# Altium footprint library 3.22-杂项.PcbLib: 199 footprints (part 7 of 15)
Each footprint in its own frame and in the unit in brackets; x right, y up, seen from the top. Pads: shape width x height; smd on the part's side, far side on the other; paste and mask are expansions set on the pad; w line width, h text height; cw(c..) or ccw(c..) is an arc to the next point about the centre after c.
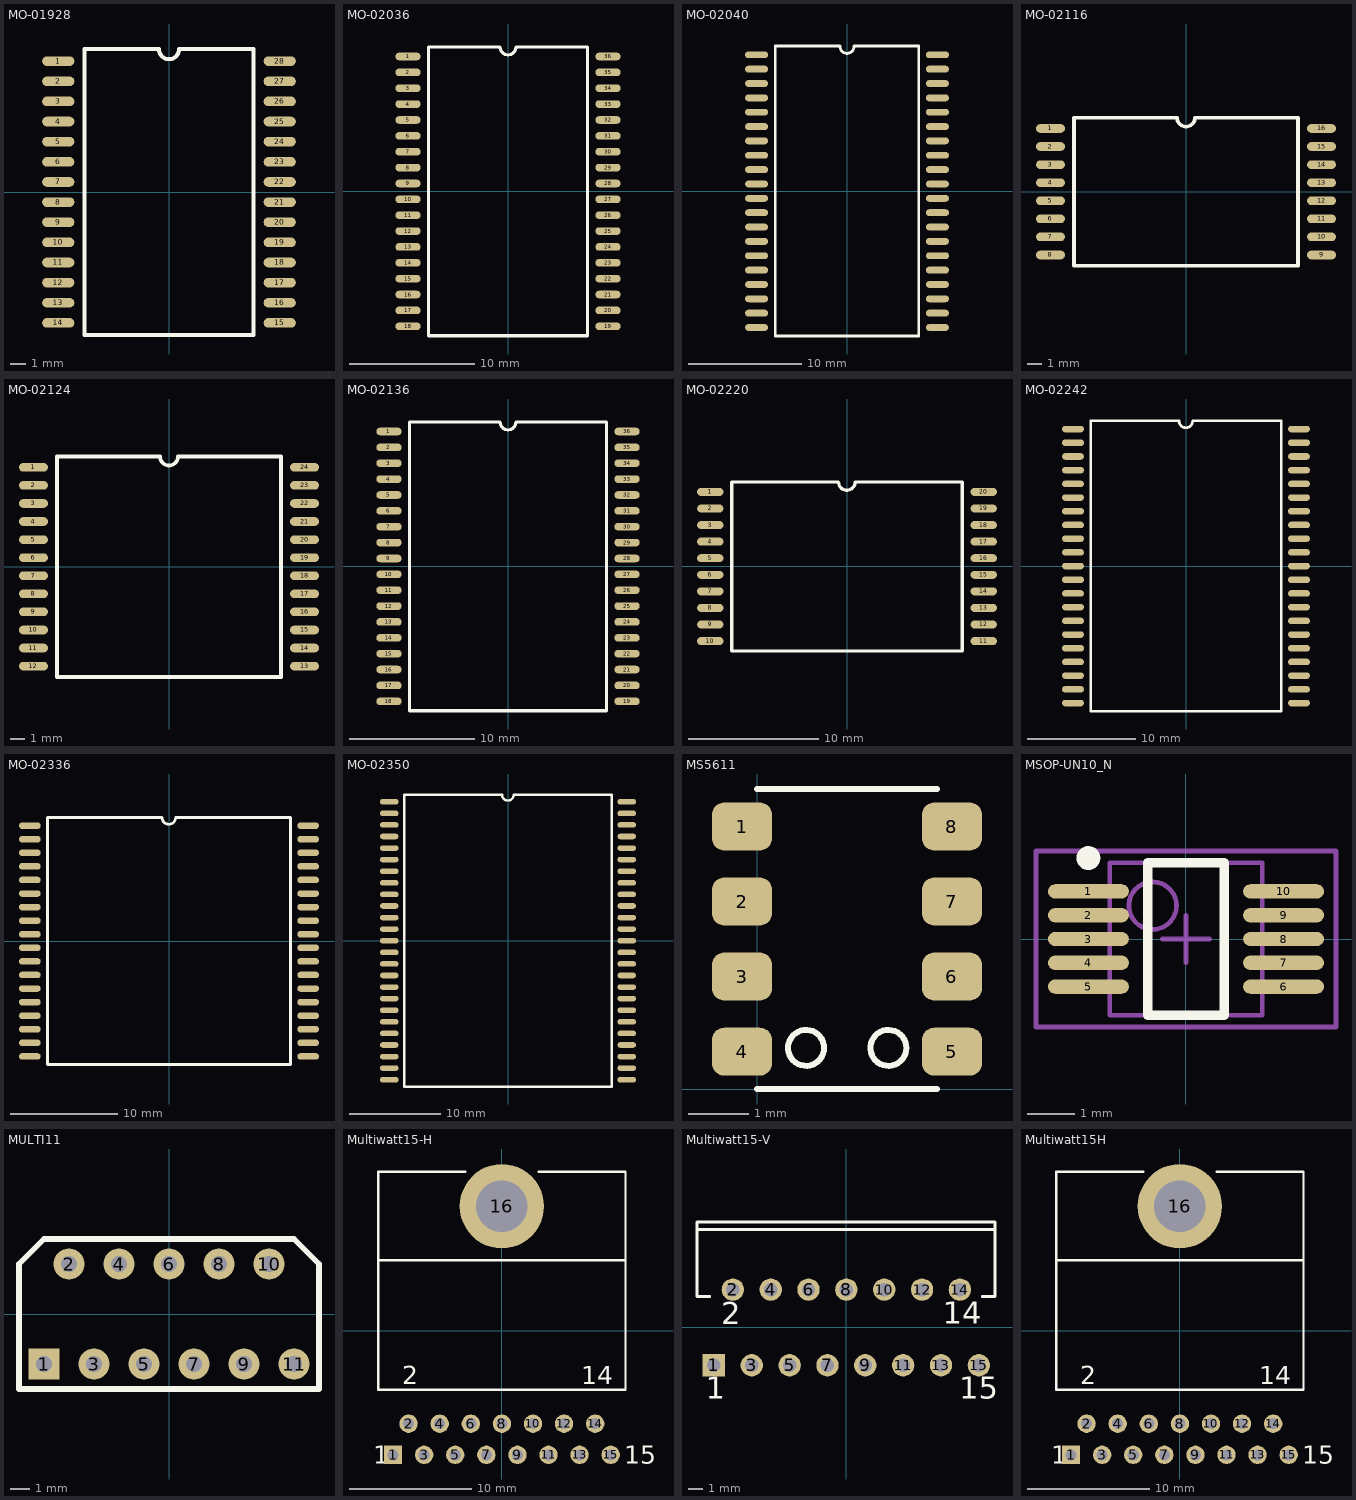
[diagram p6: the footprints below, top view; thin cyan lines are the x and y axes]

## MO-01928 [mil] "[ PCBѧϰȺ514746572 ]"
pads (28):
  oval 80x24 smd: 1(-275,325) 2(-275,275) 3(-275,225) 4(-275,175) 5(-275,125) 6(-275,75) 7(-275,25) 8(-275,-25) 9(-275,-75) 10(-275,-125) 11(-275,-175) 12(-275,-225) 13(-275,-275) 14(-275,-325) 15(275,-325) 16(275,-275) 17(275,-225) 18(275,-175) 19(275,-125) 20(275,-75) 21(275,-25) 22(275,25) 23(275,75) 24(275,125) 25(275,175) 26(275,225) 27(275,275) 28(275,325)
Top Overlay:
  lines w10: -210,-355 -210,355 -25,355 ccw(c0,355) 25,355 210,355 210,-355 -210,-355

## MO-02036 [mil] "[ PCBѧϰȺ514746572 ]"
pads (36):
  oval 80x24 smd: 1(-315,425) 2(-315,375) 3(-315,325) 4(-315,275) 5(-315,225) 6(-315,175) 7(-315,125) 8(-315,75) 9(-315,25) 10(-315,-25) 11(-315,-75) 12(-315,-125) 13(-315,-175) 14(-315,-225) 15(-315,-275) 16(-315,-325) 17(-315,-375) 18(-315,-425) 19(315,-425) 20(315,-375) 21(315,-325) 22(315,-275) 23(315,-225) 24(315,-175) 25(315,-125) 26(315,-75) 27(315,-25) 28(315,25) 29(315,75) 30(315,125) 31(315,175) 32(315,225) 33(315,275) 34(315,325) 35(315,375) 36(315,425)
Top Overlay:
  lines w10: -250,-455 -250,455 -25,455 ccw(c0,455) 25,455 250,455 250,-455 -250,-455

## MO-02040 [mil] "[ PCBѧϰȺ514746572 ]"
pads (40):
  oval 80x24 smd: 1(-315,475) 2(-315,425) 3(-315,375) 4(-315,325) 5(-315,275) 6(-315,225) 7(-315,175) 8(-315,125) 9(-315,75) 10(-315,25) 11(-315,-25) 12(-315,-75) 13(-315,-125) 14(-315,-175) 15(-315,-225) 16(-315,-275) 17(-315,-325) 18(-315,-375) 19(-315,-425) 20(-315,-475) 21(315,-475) 22(315,-425) 23(315,-375) 24(315,-325) 25(315,-275) 26(315,-225) 27(315,-175) 28(315,-125) 29(315,-75) 30(315,-25) 31(315,25) 32(315,75) 33(315,125) 34(315,175) 35(315,225) 36(315,275) 37(315,325) 38(315,375) 39(315,425) 40(315,475)
Top Overlay:
  lines w10: -250,-505 -250,505 -25,505 ccw(c0,505) 25,505 250,505 250,-505 -250,-505

## MO-02116 [mil] "[ PCBѧϰȺ514746572 ]"
pads (16):
  oval 80x24 smd: 1(-375,175) 2(-375,125) 3(-375,75) 4(-375,25) 5(-375,-25) 6(-375,-75) 7(-375,-125) 8(-375,-175) 9(375,-175) 10(375,-125) 11(375,-75) 12(375,-25) 13(375,25) 14(375,75) 15(375,125) 16(375,175)
Top Overlay:
  lines w10: -310,-205 -310,205 -25,205 ccw(c0,205) 25,205 310,205 310,-205 -310,-205

## MO-02124 [mil] "[ PCBѧϰȺ514746572 ]"
pads (24):
  oval 80x24 smd: 1(-375,275) 2(-375,225) 3(-375,175) 4(-375,125) 5(-375,75) 6(-375,25) 7(-375,-25) 8(-375,-75) 9(-375,-125) 10(-375,-175) 11(-375,-225) 12(-375,-275) 13(375,-275) 14(375,-225) 15(375,-175) 16(375,-125) 17(375,-75) 18(375,-25) 19(375,25) 20(375,75) 21(375,125) 22(375,175) 23(375,225) 24(375,275)
Top Overlay:
  lines w10: -310,-305 -310,305 -25,305 ccw(c0,305) 25,305 310,305 310,-305 -310,-305

## MO-02136 [mil] "[ PCBѧϰȺ514746572 ]"
pads (36):
  oval 80x24 smd: 1(-375,425) 2(-375,375) 3(-375,325) 4(-375,275) 5(-375,225) 6(-375,175) 7(-375,125) 8(-375,75) 9(-375,25) 10(-375,-25) 11(-375,-75) 12(-375,-125) 13(-375,-175) 14(-375,-225) 15(-375,-275) 16(-375,-325) 17(-375,-375) 18(-375,-425) 19(375,-425) 20(375,-375) 21(375,-325) 22(375,-275) 23(375,-225) 24(375,-175) 25(375,-125) 26(375,-75) 27(375,-25) 28(375,25) 29(375,75) 30(375,125) 31(375,175) 32(375,225) 33(375,275) 34(375,325) 35(375,375) 36(375,425)
Top Overlay:
  lines w10: -310,-455 -310,455 -25,455 ccw(c0,455) 25,455 310,455 310,-455 -310,-455

## MO-02220 [mil] "[ PCBѧϰȺ514746572 ]"
pads (20):
  oval 80x24 smd: 1(-412.5,225) 2(-412.5,175) 3(-412.5,125) 4(-412.5,75) 5(-412.5,25) 6(-412.5,-25) 7(-412.5,-75) 8(-412.5,-125) 9(-412.5,-175) 10(-412.5,-225) 11(412.5,-225) 12(412.5,-175) 13(412.5,-125) 14(412.5,-75) 15(412.5,-25) 16(412.5,25) 17(412.5,75) 18(412.5,125) 19(412.5,175) 20(412.5,225)
Top Overlay:
  lines w10: -347.5,-255 -347.5,255 -25.5,255 ccw(c-0.5,255) 24.5,255 347.5,255 347.5,-255 -347.5,-255

## MO-02242 [mil] "[ PCBѧϰȺ514746572 ]"
pads (42):
  oval 80x24 smd: 1(-412.5,500) 2(-412.5,450) 3(-412.5,400) 4(-412.5,350) 5(-412.5,300) 6(-412.5,250) 7(-412.5,200) 8(-412.5,150) 9(-412.5,100) 10(-412.5,50) 11(-412.5,0) 12(-412.5,-50) 13(-412.5,-100) 14(-412.5,-150) 15(-412.5,-200) 16(-412.5,-250) 17(-412.5,-300) 18(-412.5,-350) 19(-412.5,-400) 20(-412.5,-450) 21(-412.5,-500) 22(412.5,-500) 23(412.5,-450) 24(412.5,-400) 25(412.5,-350) 26(412.5,-300) 27(412.5,-250) 28(412.5,-200) 29(412.5,-150) 30(412.5,-100) 31(412.5,-50) 32(412.5,0) 33(412.5,50) 34(412.5,100) 35(412.5,150) 36(412.5,200) 37(412.5,250) 38(412.5,300) 39(412.5,350) 40(412.5,400) 41(412.5,450) 42(412.5,500)
Top Overlay:
  lines w10: -347.5,-530 347.5,-530 347.5,530 24.5,530 cw(c-0.5,530) -25.5,530 -347.5,530 -347.5,-530

## MO-02336 [mil] "[ PCBѧϰȺ514746572 ]"
pads (36):
  oval 80x24 smd: 1(-512.5,425) 2(-512.5,375) 3(-512.5,325) 4(-512.5,275) 5(-512.5,225) 6(-512.5,175) 7(-512.5,125) 8(-512.5,75) 9(-512.5,25) 10(-512.5,-25) 11(-512.5,-75) 12(-512.5,-125) 13(-512.5,-175) 14(-512.5,-225) 15(-512.5,-275) 16(-512.5,-325) 17(-512.5,-375) 18(-512.5,-425) 19(512.5,-425) 20(512.5,-375) 21(512.5,-325) 22(512.5,-275) 23(512.5,-225) 24(512.5,-175) 25(512.5,-125) 26(512.5,-75) 27(512.5,-25) 28(512.5,25) 29(512.5,75) 30(512.5,125) 31(512.5,175) 32(512.5,225) 33(512.5,275) 34(512.5,325) 35(512.5,375) 36(512.5,425)
Top Overlay:
  lines w10: -447.5,-455 -447.5,455 -25.5,455 ccw(c-0.5,455) 24.5,455 447.5,455 447.5,-455 -447.5,-455

## MO-02350 [mil] "[ PCBѧϰȺ514746572 ]"
pads (50):
  oval 80x24 smd: 1(-512.5,600) 2(-512.5,550) 3(-512.5,500) 4(-512.5,450) 5(-512.5,400) 6(-512.5,350) 7(-512.5,300) 8(-512.5,250) 9(-512.5,200) 10(-512.5,150) 11(-512.5,100) 12(-512.5,50) 13(-512.5,0) 14(-512.5,-50) 15(-512.5,-100) 16(-512.5,-150) 17(-512.5,-200) 18(-512.5,-250) 19(-512.5,-300) 20(-512.5,-350) 21(-512.5,-400) 22(-512.5,-450) 23(-512.5,-500) 24(-512.5,-550) 25(-512.5,-600) 26(512.5,-600) 27(512.5,-550) 28(512.5,-500) 29(512.5,-450) 30(512.5,-400) 31(512.5,-350) 32(512.5,-300) 33(512.5,-250) 34(512.5,-200) 35(512.5,-150) 36(512.5,-100) 37(512.5,-50) 38(512.5,0) 39(512.5,50) 40(512.5,100) 41(512.5,150) 42(512.5,200) 43(512.5,250) 44(512.5,300) 45(512.5,350) 46(512.5,400) 47(512.5,450) 48(512.5,500) 49(512.5,550) 50(512.5,600)
Top Overlay:
  lines w10: -447.5,-630 -447.5,630 -25.5,630 ccw(c-0.5,630) 24.5,630 447.5,630 447.5,-630 -447.5,-630

## MS5611 [mm] "[ PCBѧϰȺ514746572 ]"
pads (8):
  rrect50% 1x0.8 smd: 1(-0.25,4.375) 2(-0.25,3.124) 3(-0.25,1.873) 4(-0.25,0.622) 5(3.25,0.622) 6(3.25,1.873) 7(3.25,3.124) 8(3.25,4.375)
Top Overlay:
  circle w0.1: c0.818,0.686 r0.3
  circle w0.1: c2.189,0.686 r0.3
  lines w0.1: 0,0 3,0 ; 0,5 3,5
3D body: height 1, standoff 0.3, extent 0,0 2.997,5.004

## MSOP-UN10_N [mm] "TSSOP      [ PCBѧϰȺ514746572 ]"
height 1.1
pads (10):
  oval 1.7x0.3 smd: 1(-2.05,1) 2(-2.05,0.5) 3(-2.05,0) 4(-2.05,-0.5) 5(-2.05,-1) 6(2.05,-1) 7(2.05,-0.5) 8(2.05,0) 9(2.05,0.5) 10(2.05,1)
Top Overlay:
  circle w0.25: c-2.05,1.7 r0.125
  lines w0.2: -0.8,-1.6 -0.8,1.6 0.8,1.6 0.8,-1.6 -0.8,-1.6
Mechanical 13:
  circle w0.1: c-0.7,0.7 r0.5
  lines w0.1: -1.6,-1.6 -1.6,1.6 1.6,1.6 1.6,-1.6 -1.6,-1.6
Mechanical 15:
  lines w0.1: -0.5,0 0.5,0 ; 0,-0.5 0,0.5 ; -3.15,-1.85 -3.15,1.85 3.15,1.85 3.15,-1.85 -3.15,-1.85
3D body: height 1.1, standoff 0, extent -1.6,-1.6 1.6,1.6

## MULTI11 [mil] "[ PCBѧϰȺ514746572 ]"
pads (11):
  rect 62x62 hole 32: 1(-250,-100)
  round 62 hole 32: 2(-200,100) 3(-150,-100) 4(-100,100) 5(-50,-100) 6(0,100) 7(50,-100) 8(100,100) 9(150,-100) 10(200,100) 11(250,-100)
Top Overlay:
  lines w12: -300,-150 300,-150 300,100 250,150 -250,150 -300,100 -300,-150

## Multiwatt15-H [mm] "[ PCBѧϰȺ514746572 ]"
height 5
pads (16):
  rect 1.5x1.5 hole 0.9: 1(-8.89,-10.155)
  round 1.5 hole 0.9: 2(-7.62,-7.615) 3(-6.35,-10.155) 4(-5.08,-7.615) 5(-3.81,-10.155) 6(-2.54,-7.615) 7(-1.27,-10.155) 8(0,-7.615) 9(1.27,-10.155) 10(2.54,-7.615) 11(3.81,-10.155) 12(5.08,-7.615) 13(6.35,-10.155) 14(7.62,-7.615) 15(8.89,-10.155)
  round 6.9 hole 4.2: 16(0,10.155)
Top Overlay:
  lines w0.2: -10.1,5.755 10.1,5.755 ; -3,12.955 -10.1,12.955 -10.1,-4.845 10.1,-4.845 10.1,12.955 3,12.955
  text "2" at -8.12,-4.37 h1.5
  text "14" at 6.495,-4.37 h1.5
  text "15" at 10.015,-10.905 h1.5
  text "1" at -10.515,-10.905 h1.5

## Multiwatt15-V [mm] "[ PCBѧϰȺ514746572 ]"
height 21
pads (15):
  rect 1.5x1.5 hole 0.9: 1(-8.89,-2.54)
  round 1.5 hole 0.9: 2(-7.62,2.54) 3(-6.35,-2.54) 4(-5.08,2.54) 5(-3.81,-2.54) 6(-2.54,2.54) 7(-1.27,-2.54) 8(0,2.54) 9(1.27,-2.54) 10(2.54,2.54) 11(3.81,-2.54) 12(5.08,2.54) 13(6.35,-2.54) 14(7.62,2.54) 15(8.89,-2.54)
Top Overlay:
  lines w0.2: -10.025,6.59 9.975,6.59 ; -9.169,2.09 -10.025,2.09 -10.025,7.09 9.975,7.09 9.975,2.09 9.119,2.09
  text "15" at 7.569,-5.283 h2.54
  text "1" at -9.449,-5.283 h2.54
  text "14" at 6.452,-0.254 h2.54
  text "2" at -8.382,-0.279 h2.54
3D body "L298N-Multiwatt15V.STEP": height 20.3, standoff -2, extent -9.825,-3.032 9.775,6.858

## Multiwatt15H [mm] "ST L298N ZIP封装      [ PCB学习群514746572 ]"
pads (16):
  rect 1.5x1.5 hole 0.9: 1(-8.89,-10.155)
  round 1.5 hole 0.9: 2(-7.62,-7.615) 3(-6.35,-10.155) 4(-5.08,-7.615) 5(-3.81,-10.155) 6(-2.54,-7.615) 7(-1.27,-10.155) 8(0,-7.615) 9(1.27,-10.155) 10(2.54,-7.615) 11(3.81,-10.155) 12(5.08,-7.615) 13(6.35,-10.155) 14(7.62,-7.615) 15(8.89,-10.155)
  round 6.9 hole 4.2: 16(0,10.155)
Top Overlay:
  lines w0.2: -10.1,5.755 10.1,5.755 ; -3,12.955 -10.1,12.955 -10.1,-4.845 10.1,-4.845 10.1,12.955 3,12.955
  text "2" at -8.12,-4.37 h1.5
  text "14" at 6.495,-4.37 h1.5
  text "15" at 10.015,-10.905 h1.5
  text "1" at -10.515,-10.905 h1.5